# Altium schematic symbol library jlcpcb_2025_04_capacitors_extended_0805.schlib: 3281 symbols (part 7 of 18)
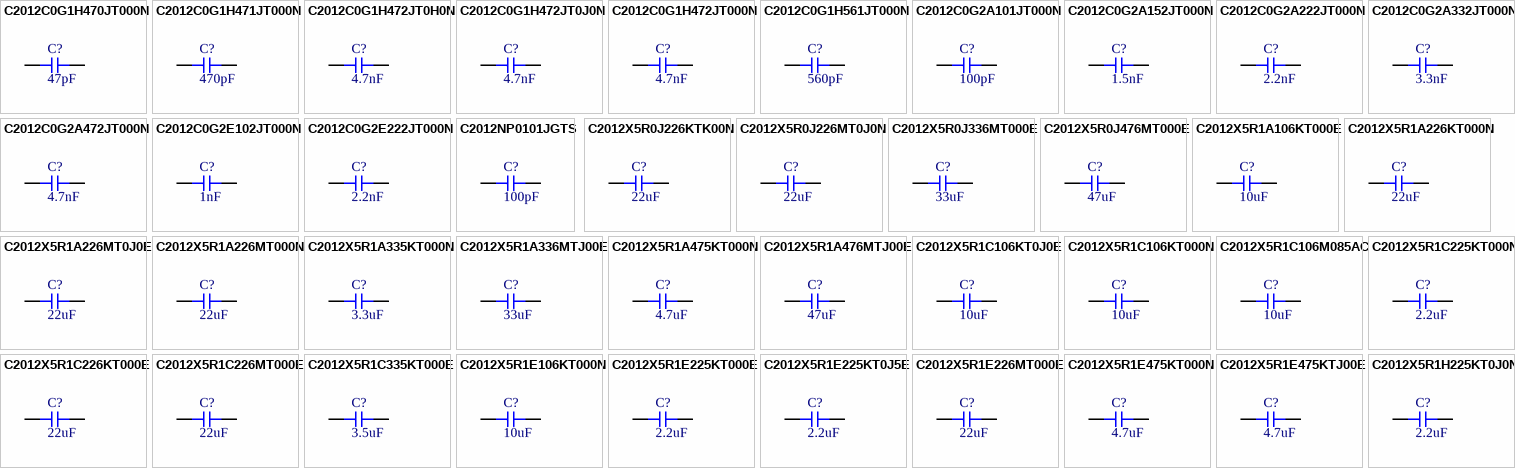
[diagram p88: symbols C2012C0G1H470JT000N to C2012X5R1H225KT0J0N]

## C2012C0G2E102JT000N
designator C?  Capacitance: 1nF  (hidden comment: *)
Capacitor, Ceramic (MLCC), 1nF, ±5%, 250V, C0G, ±5%, SMD 0805; Manufacturer: TDK; Manufacturer Part Number: C2012C0G2E102JT000N; Package Size: 0805; JLCPCB Basic Part: No; JLCPCB Part Number: C343010; Supplier 1: LCSC; Category: Capacitors - MLCC; Supplier Part Number 1: C343010; Tolerance: ±5%; Voltage Rating: 250V; Temperature Coefficient: C0G; RoHS: Yes; ComponentLink1Description: Datasheet; ComponentLink1URL: https://wmsc.lcsc.com/wmsc/upload/file/pdf/v2/lcsc/2304140030_TDK-C2012C0G2E102JT000N_C343010.pdf; ComponentLink2Description: JLCPCB Part URL; ComponentLink2URL: https://jlcpcb.com/partdetail/C343010; ComponentLink3Description: LCSC Part URL; ComponentLink3URL: https://lcsc.com/product-detail/Multilayer-Ceramic-Capacitors-MLCC---SMD-SMT_TDK-TDK-C2012C0G2E102JT000N_C343010.html
footprint CAP-0805 (0805 (2012M) Capacitor)
pins: 1, 2

## C2012C0G2E222JT000N
designator C?  Capacitance: 2.2nF  (hidden comment: *)
Capacitor, Ceramic (MLCC), 2.2nF, ±5%, 250V, C0G, ±5%, SMD 0805; Manufacturer: TDK; Manufacturer Part Number: C2012C0G2E222JT000N; Package Size: 0805; JLCPCB Basic Part: No; JLCPCB Part Number: C342971; Supplier 1: LCSC; Category: Capacitors - MLCC; Supplier Part Number 1: C342971; Tolerance: ±5%; Voltage Rating: 250V; Temperature Coefficient: C0G; RoHS: Yes; ComponentLink1Description: Datasheet; ComponentLink1URL: https://wmsc.lcsc.com/wmsc/upload/file/pdf/v2/lcsc/2304140030_TDK-C2012C0G2E222JT000N_C342971.pdf; ComponentLink2Description: JLCPCB Part URL; ComponentLink2URL: https://jlcpcb.com/partdetail/C342971; ComponentLink3Description: LCSC Part URL; ComponentLink3URL: https://lcsc.com/product-detail/Multilayer-Ceramic-Capacitors-MLCC---SMD-SMT_TDK-TDK-C2012C0G2E222JT000N_C342971.html
footprint CAP-0805 (0805 (2012M) Capacitor)
pins: 1, 2

## C2012NP0101JGTS
designator C?  Capacitance: 100pF  (hidden comment: *)
Capacitor, Ceramic (MLCC), 100pF, ±5%, 50V, NP0, ±5%, SMD 0805; Manufacturer: Darfon Elec; Manufacturer Part Number: C2012NP0101JGTS; Package Size: 0805; JLCPCB Basic Part: No; JLCPCB Part Number: C725576; Supplier 1: LCSC; Category: Capacitors - MLCC; Supplier Part Number 1: C725576; Tolerance: ±5%; Voltage Rating: 50V; Temperature Coefficient: NP0; RoHS: Yes; ComponentLink1Description: Datasheet; ComponentLink1URL: https://wmsc.lcsc.com/wmsc/upload/file/pdf/v2/lcsc/2304140030_Darfon-Elec-C2012NP0101JGTS_C725576.pdf; ComponentLink2Description: JLCPCB Part URL; ComponentLink2URL: https://jlcpcb.com/partdetail/C725576; ComponentLink3Description: LCSC Part URL; ComponentLink3URL: https://lcsc.com/product-detail/Multilayer-Ceramic-Capacitors-MLCC---SMD-SMT_Darfon-Elec-Darfon-Elec-C2012NP0101JGTS_C725576.html
footprint CAP-0805 (0805 (2012M) Capacitor)
pins: 1, 2

## C2012X5R0J226KTK00N
designator C?  Capacitance: 22uF  (hidden comment: *)
Capacitor, Ceramic (MLCC), 22uF, ±10%, 6.3V, X5R, ±10%, SMD 0805; Manufacturer: TDK; Manufacturer Part Number: C2012X5R0J226KTK00N; Package Size: 0805; JLCPCB Basic Part: No; JLCPCB Part Number: C342679; Supplier 1: LCSC; Category: Capacitors - MLCC; Supplier Part Number 1: C342679; Tolerance: ±10%; Voltage Rating: 6.3V; Temperature Coefficient: X5R; RoHS: Yes; ComponentLink1Description: Datasheet; ComponentLink1URL: https://wmsc.lcsc.com/wmsc/upload/file/pdf/v2/lcsc/2304140030_TDK-C2012X5R0J226KTK00N_C342679.pdf; ComponentLink2Description: JLCPCB Part URL; ComponentLink2URL: https://jlcpcb.com/partdetail/C342679; ComponentLink3Description: LCSC Part URL; ComponentLink3URL: https://lcsc.com/product-detail/Multilayer-Ceramic-Capacitors-MLCC---SMD-SMT_TDK-TDK-C2012X5R0J226KTK00N_C342679.html
footprint CAP-0805 (0805 (2012M) Capacitor)
pins: 1, 2

## C2012X5R0J226MT0J0N
designator C?  Capacitance: 22uF  (hidden comment: *)
Capacitor, Ceramic (MLCC), 22uF, ±20%, 6.3V, X5R, ±20%, SMD 0805; Manufacturer: TDK; Manufacturer Part Number: C2012X5R0J226MT0J0N; Package Size: 0805; JLCPCB Basic Part: No; JLCPCB Part Number: C695149; Supplier 1: LCSC; Category: Capacitors - MLCC; Supplier Part Number 1: C695149; Tolerance: ±20%; Voltage Rating: 6.3V; Temperature Coefficient: X5R; RoHS: Yes; ComponentLink1Description: Datasheet; ComponentLink1URL: https://wmsc.lcsc.com/wmsc/upload/file/pdf/v2/lcsc/2304140030_TDK-C2012X5R0J226MT0J0N_C695149.pdf; ComponentLink2Description: JLCPCB Part URL; ComponentLink2URL: https://jlcpcb.com/partdetail/C695149; ComponentLink3Description: LCSC Part URL; ComponentLink3URL: https://lcsc.com/product-detail/Multilayer-Ceramic-Capacitors-MLCC---SMD-SMT_TDK-TDK-C2012X5R0J226MT0J0N_C695149.html
footprint CAP-0805 (0805 (2012M) Capacitor)
pins: 1, 2

## C2012X5R0J336MT000E
designator C?  Capacitance: 33uF  (hidden comment: *)
Capacitor, Ceramic (MLCC), 33uF, ±20%, 6.3V, X5R, ±20%, SMD 0805; Manufacturer: TDK; Manufacturer Part Number: C2012X5R0J336MT000E; Package Size: 0805; JLCPCB Basic Part: No; JLCPCB Part Number: C432920; Supplier 1: LCSC; Category: Capacitors - MLCC; Supplier Part Number 1: C432920; Tolerance: ±20%; Voltage Rating: 6.3V; Temperature Coefficient: X5R; RoHS: Yes; ComponentLink1Description: Datasheet; ComponentLink1URL: https://wmsc.lcsc.com/wmsc/upload/file/pdf/v2/lcsc/2304140030_TDK-C2012X5R0J336MT000E_C432920.pdf; ComponentLink2Description: JLCPCB Part URL; ComponentLink2URL: https://jlcpcb.com/partdetail/C432920; ComponentLink3Description: LCSC Part URL; ComponentLink3URL: https://lcsc.com/product-detail/Multilayer-Ceramic-Capacitors-MLCC---SMD-SMT_TDK-TDK-C2012X5R0J336MT000E_C432920.html
footprint CAP-0805 (0805 (2012M) Capacitor)
pins: 1, 2

## C2012X5R0J476MT000E
designator C?  Capacitance: 47uF  (hidden comment: *)
Capacitor, Ceramic (MLCC), 47uF, ±20%, 6.3V, X5R, ±20%, SMD 0805; Manufacturer: TDK; Manufacturer Part Number: C2012X5R0J476MT000E; Package Size: 0805; JLCPCB Basic Part: No; JLCPCB Part Number: C342749; Supplier 1: LCSC; Category: Capacitors - MLCC; Supplier Part Number 1: C342749; Tolerance: ±20%; Voltage Rating: 6.3V; Temperature Coefficient: X5R; RoHS: Yes; ComponentLink1Description: Datasheet; ComponentLink1URL: https://wmsc.lcsc.com/wmsc/upload/file/pdf/v2/lcsc/2304140030_TDK-C2012X5R0J476MT000E_C342749.pdf; ComponentLink2Description: JLCPCB Part URL; ComponentLink2URL: https://jlcpcb.com/partdetail/C342749; ComponentLink3Description: LCSC Part URL; ComponentLink3URL: https://lcsc.com/product-detail/Multilayer-Ceramic-Capacitors-MLCC---SMD-SMT_TDK-TDK-C2012X5R0J476MT000E_C342749.html
footprint CAP-0805 (0805 (2012M) Capacitor)
pins: 1, 2

## C2012X5R1A106KT000E
designator C?  Capacitance: 10uF  (hidden comment: *)
Capacitor, Ceramic (MLCC), 10uF, ±10%, 10V, X5R, ±10%, SMD 0805; Manufacturer: TDK; Manufacturer Part Number: C2012X5R1A106KT000E; Package Size: 0805; JLCPCB Basic Part: No; JLCPCB Part Number: C329960; Supplier 1: LCSC; Category: Capacitors - MLCC; Supplier Part Number 1: C329960; Tolerance: ±10%; Voltage Rating: 10V; Temperature Coefficient: X5R; RoHS: Yes; ComponentLink1Description: Datasheet; ComponentLink1URL: https://wmsc.lcsc.com/wmsc/upload/file/pdf/v2/lcsc/2201242230_TDK-C2012X5R1A106KT000E_C329960.pdf; ComponentLink2Description: JLCPCB Part URL; ComponentLink2URL: https://jlcpcb.com/partdetail/C329960; ComponentLink3Description: LCSC Part URL; ComponentLink3URL: https://lcsc.com/product-detail/Multilayer-Ceramic-Capacitors-MLCC---SMD-SMT_TDK-TDK-C2012X5R1A106KT000E_C329960.html
footprint CAP-0805 (0805 (2012M) Capacitor)
pins: 1, 2

## C2012X5R1A226KT000N
designator C?  Capacitance: 22uF  (hidden comment: *)
Capacitor, Ceramic (MLCC), 22uF, ±10%, 10V, X5R, ±10%, SMD 0805; Manufacturer: TDK; Manufacturer Part Number: C2012X5R1A226KT000N; Package Size: 0805; JLCPCB Basic Part: No; JLCPCB Part Number: C76634; Supplier 1: LCSC; Category: Capacitors - MLCC; Supplier Part Number 1: C76634; Tolerance: ±10%; Voltage Rating: 10V; Temperature Coefficient: X5R; RoHS: Yes; ComponentLink1Description: Datasheet; ComponentLink1URL: https://wmsc.lcsc.com/wmsc/upload/file/pdf/v2/lcsc/2304140030_TDK-C2012X5R1A226KT000N_C76634.pdf; ComponentLink2Description: JLCPCB Part URL; ComponentLink2URL: https://jlcpcb.com/partdetail/C76634; ComponentLink3Description: LCSC Part URL; ComponentLink3URL: https://lcsc.com/product-detail/Multilayer-Ceramic-Capacitors-MLCC---SMD-SMT_TDK-TDK-C2012X5R1A226KT000N_C76634.html
footprint CAP-0805 (0805 (2012M) Capacitor)
pins: 1, 2

## C2012X5R1A226MT0J0E
designator C?  Capacitance: 22uF  (hidden comment: *)
Capacitor, Ceramic (MLCC), 22uF, ±20%, 10V, X5R, ±20%, SMD 0805; Manufacturer: TDK; Manufacturer Part Number: C2012X5R1A226MT0J0E; Package Size: 0805; JLCPCB Basic Part: No; JLCPCB Part Number: C361180; Supplier 1: LCSC; Category: Capacitors - MLCC; Supplier Part Number 1: C361180; Tolerance: ±20%; Voltage Rating: 10V; Temperature Coefficient: X5R; RoHS: Yes; ComponentLink1Description: Datasheet; ComponentLink1URL: https://wmsc.lcsc.com/wmsc/upload/file/pdf/v2/lcsc/1912111437_TDK-C2012X5R1A226MT0J0E_C361180.pdf; ComponentLink2Description: JLCPCB Part URL; ComponentLink2URL: https://jlcpcb.com/partdetail/C361180; ComponentLink3Description: LCSC Part URL; ComponentLink3URL: https://lcsc.com/product-detail/Multilayer-Ceramic-Capacitors-MLCC---SMD-SMT_TDK-TDK-C2012X5R1A226MT0J0E_C361180.html
footprint CAP-0805 (0805 (2012M) Capacitor)
pins: 1, 2

## C2012X5R1A226MT000N
designator C?  Capacitance: 22uF  (hidden comment: *)
Capacitor, Ceramic (MLCC), 22uF, ±20%, 10V, X5R, ±20%, SMD 0805; Manufacturer: TDK; Manufacturer Part Number: C2012X5R1A226MT000N; Package Size: 0805; JLCPCB Basic Part: No; JLCPCB Part Number: C342715; Supplier 1: LCSC; Category: Capacitors - MLCC; Supplier Part Number 1: C342715; Tolerance: ±20%; Voltage Rating: 10V; Temperature Coefficient: X5R; RoHS: Yes; ComponentLink1Description: Datasheet; ComponentLink1URL: https://wmsc.lcsc.com/wmsc/upload/file/pdf/v2/lcsc/2304140030_TDK-C2012X5R1A226MT000N_C342715.pdf; ComponentLink2Description: JLCPCB Part URL; ComponentLink2URL: https://jlcpcb.com/partdetail/C342715; ComponentLink3Description: LCSC Part URL; ComponentLink3URL: https://lcsc.com/product-detail/Multilayer-Ceramic-Capacitors-MLCC---SMD-SMT_TDK-TDK-C2012X5R1A226MT000N_C342715.html
footprint CAP-0805 (0805 (2012M) Capacitor)
pins: 1, 2

## C2012X5R1A335KT000N
designator C?  Capacitance: 3.3uF  (hidden comment: *)
Capacitor, Ceramic (MLCC), 3.3uF, ±10%, 10V, X5R, ±10%, SMD 0805; Manufacturer: TDK; Manufacturer Part Number: C2012X5R1A335KT000N; Package Size: 0805; JLCPCB Basic Part: No; JLCPCB Part Number: C76635; Supplier 1: LCSC; Category: Capacitors - MLCC; Supplier Part Number 1: C76635; Tolerance: ±10%; Voltage Rating: 10V; Temperature Coefficient: X5R; RoHS: Yes; ComponentLink1Description: Datasheet; ComponentLink1URL: https://wmsc.lcsc.com/wmsc/upload/file/pdf/v2/lcsc/2304140030_TDK-C2012X5R1A335KT000N_C76635.pdf; ComponentLink2Description: JLCPCB Part URL; ComponentLink2URL: https://jlcpcb.com/partdetail/C76635; ComponentLink3Description: LCSC Part URL; ComponentLink3URL: https://lcsc.com/product-detail/Multilayer-Ceramic-Capacitors-MLCC---SMD-SMT_TDK-TDK-C2012X5R1A335KT000N_C76635.html
footprint CAP-0805 (0805 (2012M) Capacitor)
pins: 1, 2

## C2012X5R1A336MTJ00E
designator C?  Capacitance: 33uF  (hidden comment: *)
Capacitor, Ceramic (MLCC), 33uF, ±20%, 10V, X5R, ±20%, SMD 0805; Manufacturer: TDK; Manufacturer Part Number: C2012X5R1A336MTJ00E; Package Size: 0805; JLCPCB Basic Part: No; JLCPCB Part Number: C342635; Supplier 1: LCSC; Category: Capacitors - MLCC; Supplier Part Number 1: C342635; Tolerance: ±20%; Voltage Rating: 10V; Temperature Coefficient: X5R; RoHS: Yes; ComponentLink1Description: Datasheet; ComponentLink1URL: https://wmsc.lcsc.com/wmsc/upload/file/pdf/v2/lcsc/2304140030_TDK-C2012X5R1A336MTJ00E_C342635.pdf; ComponentLink2Description: JLCPCB Part URL; ComponentLink2URL: https://jlcpcb.com/partdetail/C342635; ComponentLink3Description: LCSC Part URL; ComponentLink3URL: https://lcsc.com/product-detail/Multilayer-Ceramic-Capacitors-MLCC---SMD-SMT_TDK-TDK-C2012X5R1A336MTJ00E_C342635.html
footprint CAP-0805 (0805 (2012M) Capacitor)
pins: 1, 2

## C2012X5R1A475KT000N
designator C?  Capacitance: 4.7uF  (hidden comment: *)
Capacitor, Ceramic (MLCC), 4.7uF, ±10%, 10V, X5R, ±10%, SMD 0805; Manufacturer: TDK; Manufacturer Part Number: C2012X5R1A475KT000N; Package Size: 0805; JLCPCB Basic Part: No; JLCPCB Part Number: C338005; Supplier 1: LCSC; Category: Capacitors - MLCC; Supplier Part Number 1: C338005; Tolerance: ±10%; Voltage Rating: 10V; Temperature Coefficient: X5R; RoHS: Yes; ComponentLink1Description: Datasheet; ComponentLink1URL: https://wmsc.lcsc.com/wmsc/upload/file/pdf/v2/lcsc/2304140030_TDK-C2012X5R1A475KT000N_C338005.pdf; ComponentLink2Description: JLCPCB Part URL; ComponentLink2URL: https://jlcpcb.com/partdetail/C338005; ComponentLink3Description: LCSC Part URL; ComponentLink3URL: https://lcsc.com/product-detail/Multilayer-Ceramic-Capacitors-MLCC---SMD-SMT_TDK-TDK-C2012X5R1A475KT000N_C338005.html
footprint CAP-0805 (0805 (2012M) Capacitor)
pins: 1, 2

## C2012X5R1A476MTJ00E
designator C?  Capacitance: 47uF  (hidden comment: *)
Capacitor, Ceramic (MLCC), 47uF, ±20%, 10V, X5R, ±20%, SMD 0805; Manufacturer: TDK; Manufacturer Part Number: C2012X5R1A476MTJ00E; Package Size: 0805; JLCPCB Basic Part: No; JLCPCB Part Number: C76636; Supplier 1: LCSC; Category: Capacitors - MLCC; Supplier Part Number 1: C76636; Tolerance: ±20%; Voltage Rating: 10V; Temperature Coefficient: X5R; RoHS: Yes; ComponentLink1Description: Datasheet; ComponentLink1URL: https://wmsc.lcsc.com/wmsc/upload/file/pdf/v2/lcsc/2312061731_TDK-C2012X5R1A476MTJ00E_C76636.pdf; ComponentLink2Description: JLCPCB Part URL; ComponentLink2URL: https://jlcpcb.com/partdetail/C76636; ComponentLink3Description: LCSC Part URL; ComponentLink3URL: https://lcsc.com/product-detail/Multilayer-Ceramic-Capacitors-MLCC---SMD-SMT_TDK-TDK-C2012X5R1A476MTJ00E_C76636.html
footprint CAP-0805 (0805 (2012M) Capacitor)
pins: 1, 2

## C2012X5R1C106KT0J0E
designator C?  Capacitance: 10uF  (hidden comment: *)
Capacitor, Ceramic (MLCC), 10uF, ±10%, 16V, X5R, ±10%, SMD 0805; Manufacturer: TDK; Manufacturer Part Number: C2012X5R1C106KT0J0E; Package Size: 0805; JLCPCB Basic Part: No; JLCPCB Part Number: C342740; Supplier 1: LCSC; Category: Capacitors - MLCC; Supplier Part Number 1: C342740; Tolerance: ±10%; Voltage Rating: 16V; Temperature Coefficient: X5R; RoHS: Yes; ComponentLink1Description: Datasheet; ComponentLink1URL: https://wmsc.lcsc.com/wmsc/upload/file/pdf/v2/lcsc/2304140030_TDK-C2012X5R1C106KT0J0E_C342740.pdf; ComponentLink2Description: JLCPCB Part URL; ComponentLink2URL: https://jlcpcb.com/partdetail/C342740; ComponentLink3Description: LCSC Part URL; ComponentLink3URL: https://lcsc.com/product-detail/Multilayer-Ceramic-Capacitors-MLCC---SMD-SMT_TDK-TDK-C2012X5R1C106KT0J0E_C342740.html
footprint CAP-0805 (0805 (2012M) Capacitor)
pins: 1, 2

## C2012X5R1C106KT000N
designator C?  Capacitance: 10uF  (hidden comment: *)
Capacitor, Ceramic (MLCC), 10uF, ±10%, 16V, X5R, ±10%, SMD 0805; Manufacturer: TDK; Manufacturer Part Number: C2012X5R1C106KT000N; Package Size: 0805; JLCPCB Basic Part: No; JLCPCB Part Number: C338041; Supplier 1: LCSC; Category: Capacitors - MLCC; Supplier Part Number 1: C338041; Tolerance: ±10%; Voltage Rating: 16V; Temperature Coefficient: X5R; RoHS: Yes; ComponentLink1Description: Datasheet; ComponentLink1URL: https://wmsc.lcsc.com/wmsc/upload/file/pdf/v2/lcsc/2304140030_TDK-C2012X5R1C106KT000N_C338041.pdf; ComponentLink2Description: JLCPCB Part URL; ComponentLink2URL: https://jlcpcb.com/partdetail/C338041; ComponentLink3Description: LCSC Part URL; ComponentLink3URL: https://lcsc.com/product-detail/Multilayer-Ceramic-Capacitors-MLCC---SMD-SMT_TDK-TDK-C2012X5R1C106KT000N_C338041.html
footprint CAP-0805 (0805 (2012M) Capacitor)
pins: 1, 2

## C2012X5R1C106M085AC
designator C?  Capacitance: 10uF  (hidden comment: *)
Capacitor, Ceramic (MLCC), 10uF, ±20%, 16V, X5R, ±20%, SMD 0805; Manufacturer: TDK; Manufacturer Part Number: C2012X5R1C106M085AC; Package Size: 0805; JLCPCB Basic Part: No; JLCPCB Part Number: C171747; Supplier 1: LCSC; Category: Capacitors - MLCC; Supplier Part Number 1: C171747; Tolerance: ±20%; Voltage Rating: 16V; Temperature Coefficient: X5R; RoHS: Yes; ComponentLink1Description: Datasheet; ComponentLink1URL: https://wmsc.lcsc.com/wmsc/upload/file/pdf/v2/lcsc/2304140030_TDK-C2012X5R1C106M085AC_C171747.pdf; ComponentLink2Description: JLCPCB Part URL; ComponentLink2URL: https://jlcpcb.com/partdetail/C171747; ComponentLink3Description: LCSC Part URL; ComponentLink3URL: https://lcsc.com/product-detail/Multilayer-Ceramic-Capacitors-MLCC---SMD-SMT_TDK-TDK-C2012X5R1C106M085AC_C171747.html
footprint CAP-0805 (0805 (2012M) Capacitor)
pins: 1, 2

## C2012X5R1C225KT000N
designator C?  Capacitance: 2.2uF  (hidden comment: *)
Capacitor, Ceramic (MLCC), 2.2uF, ±10%, 16V, X5R, ±10%, SMD 0805; Manufacturer: TDK; Manufacturer Part Number: C2012X5R1C225KT000N; Package Size: 0805; JLCPCB Basic Part: No; JLCPCB Part Number: C338006; Supplier 1: LCSC; Category: Capacitors - MLCC; Supplier Part Number 1: C338006; Tolerance: ±10%; Voltage Rating: 16V; Temperature Coefficient: X5R; RoHS: Yes; ComponentLink1Description: Datasheet; ComponentLink1URL: https://wmsc.lcsc.com/wmsc/upload/file/pdf/v2/lcsc/2304140030_TDK-C2012X5R1C225KT000N_C338006.pdf; ComponentLink2Description: JLCPCB Part URL; ComponentLink2URL: https://jlcpcb.com/partdetail/C338006; ComponentLink3Description: LCSC Part URL; ComponentLink3URL: https://lcsc.com/product-detail/Multilayer-Ceramic-Capacitors-MLCC---SMD-SMT_TDK-TDK-C2012X5R1C225KT000N_C338006.html
footprint CAP-0805 (0805 (2012M) Capacitor)
pins: 1, 2

## C2012X5R1C226KT000E
designator C?  Capacitance: 22uF  (hidden comment: *)
Capacitor, Ceramic (MLCC), 22uF, ±10%, 16V, X5R, ±10%, SMD 0805; Manufacturer: TDK; Manufacturer Part Number: C2012X5R1C226KT000E; Package Size: 0805; JLCPCB Basic Part: No; JLCPCB Part Number: C76637; Supplier 1: LCSC; Category: Capacitors - MLCC; Supplier Part Number 1: C76637; Tolerance: ±10%; Voltage Rating: 16V; Temperature Coefficient: X5R; RoHS: Yes; ComponentLink1Description: Datasheet; ComponentLink1URL: https://wmsc.lcsc.com/wmsc/upload/file/pdf/v2/lcsc/2304140030_TDK-C2012X5R1C226KT000E_C76637.pdf; ComponentLink2Description: JLCPCB Part URL; ComponentLink2URL: https://jlcpcb.com/partdetail/C76637; ComponentLink3Description: LCSC Part URL; ComponentLink3URL: https://lcsc.com/product-detail/Multilayer-Ceramic-Capacitors-MLCC---SMD-SMT_TDK-TDK-C2012X5R1C226KT000E_C76637.html
footprint CAP-0805 (0805 (2012M) Capacitor)
pins: 1, 2

## C2012X5R1C226MT000E
designator C?  Capacitance: 22uF  (hidden comment: *)
Capacitor, Ceramic (MLCC), 22uF, ±20%, 16V, X5R, ±20%, SMD 0805; Manufacturer: TDK; Manufacturer Part Number: C2012X5R1C226MT000E; Package Size: 0805; JLCPCB Basic Part: No; JLCPCB Part Number: C329947; Supplier 1: LCSC; Category: Capacitors - MLCC; Supplier Part Number 1: C329947; Tolerance: ±20%; Voltage Rating: 16V; Temperature Coefficient: X5R; RoHS: Yes; ComponentLink1Description: Datasheet; ComponentLink1URL: https://wmsc.lcsc.com/wmsc/upload/file/pdf/v2/lcsc/2304140030_TDK-C2012X5R1C226MT000E_C329947.pdf; ComponentLink2Description: JLCPCB Part URL; ComponentLink2URL: https://jlcpcb.com/partdetail/C329947; ComponentLink3Description: LCSC Part URL; ComponentLink3URL: https://lcsc.com/product-detail/Multilayer-Ceramic-Capacitors-MLCC---SMD-SMT_TDK-TDK-C2012X5R1C226MT000E_C329947.html
footprint CAP-0805 (0805 (2012M) Capacitor)
pins: 1, 2

## C2012X5R1C335KT000E
designator C?  Capacitance: 3.5uF  (hidden comment: *)
Capacitor, Ceramic (MLCC), 3.5uF, ±10%, 16V, X5R, ±10%, SMD 0805; Manufacturer: TDK; Manufacturer Part Number: C2012X5R1C335KT000E; Package Size: 0805; JLCPCB Basic Part: No; JLCPCB Part Number: C2939042; Supplier 1: LCSC; Category: Capacitors - MLCC; Supplier Part Number 1: C2939042; Tolerance: ±10%; Voltage Rating: 16V; Temperature Coefficient: X5R; RoHS: Yes; ComponentLink1Description: Datasheet; ComponentLink1URL: https://wmsc.lcsc.com/wmsc/upload/file/pdf/v2/lcsc/2201121830_TDK-C2012X5R1C335KT000E_C2939042.pdf; ComponentLink2Description: JLCPCB Part URL; ComponentLink2URL: https://jlcpcb.com/partdetail/C2939042; ComponentLink3Description: LCSC Part URL; ComponentLink3URL: https://lcsc.com/product-detail/Multilayer-Ceramic-Capacitors-MLCC---SMD-SMT_TDK-TDK-C2012X5R1C335KT000E_C2939042.html
footprint CAP-0805 (0805 (2012M) Capacitor)
pins: 1, 2

## C2012X5R1E106KT000N
designator C?  Capacitance: 10uF  (hidden comment: *)
Capacitor, Ceramic (MLCC), 10uF, ±10%, 25V, X5R, ±10%, SMD 0805; Manufacturer: TDK; Manufacturer Part Number: C2012X5R1E106KT000N; Package Size: 0805; JLCPCB Basic Part: No; JLCPCB Part Number: C329933; Supplier 1: LCSC; Category: Capacitors - MLCC; Supplier Part Number 1: C329933; Tolerance: ±10%; Voltage Rating: 25V; Temperature Coefficient: X5R; RoHS: Yes; ComponentLink1Description: Datasheet; ComponentLink1URL: https://wmsc.lcsc.com/wmsc/upload/file/pdf/v2/lcsc/2304140030_TDK-C2012X5R1E106KT000N_C329933.pdf; ComponentLink2Description: JLCPCB Part URL; ComponentLink2URL: https://jlcpcb.com/partdetail/C329933; ComponentLink3Description: LCSC Part URL; ComponentLink3URL: https://lcsc.com/product-detail/Multilayer-Ceramic-Capacitors-MLCC---SMD-SMT_TDK-TDK-C2012X5R1E106KT000N_C329933.html
footprint CAP-0805 (0805 (2012M) Capacitor)
pins: 1, 2

## C2012X5R1E225KT000E
designator C?  Capacitance: 2.2uF  (hidden comment: *)
Capacitor, Ceramic (MLCC), 2.2uF, ±10%, 25V, X5R, ±10%, SMD 0805; Manufacturer: TDK; Manufacturer Part Number: C2012X5R1E225KT000E; Package Size: 0805; JLCPCB Basic Part: No; JLCPCB Part Number: C342586; Supplier 1: LCSC; Category: Capacitors - MLCC; Supplier Part Number 1: C342586; Tolerance: ±10%; Voltage Rating: 25V; Temperature Coefficient: X5R; RoHS: Yes; ComponentLink1Description: Datasheet; ComponentLink1URL: https://wmsc.lcsc.com/wmsc/upload/file/pdf/v2/lcsc/2304140030_TDK-C2012X5R1E225KT000E_C342586.pdf; ComponentLink2Description: JLCPCB Part URL; ComponentLink2URL: https://jlcpcb.com/partdetail/C342586; ComponentLink3Description: LCSC Part URL; ComponentLink3URL: https://lcsc.com/product-detail/Multilayer-Ceramic-Capacitors-MLCC---SMD-SMT_TDK-TDK-C2012X5R1E225KT000E_C342586.html
footprint CAP-0805 (0805 (2012M) Capacitor)
pins: 1, 2

## C2012X5R1E225KT0J5E
designator C?  Capacitance: 2.2uF  (hidden comment: *)
Capacitor, Ceramic (MLCC), 2.2uF, ±10%, 25V, X5R, ±10%, SMD 0805; Manufacturer: TDK; Manufacturer Part Number: C2012X5R1E225KT0J5E; Package Size: 0805; JLCPCB Basic Part: No; JLCPCB Part Number: C76638; Supplier 1: LCSC; Category: Capacitors - MLCC; Supplier Part Number 1: C76638; Tolerance: ±10%; Voltage Rating: 25V; Temperature Coefficient: X5R; RoHS: Yes; ComponentLink1Description: Datasheet; ComponentLink1URL: https://wmsc.lcsc.com/wmsc/upload/file/pdf/v2/lcsc/2304140030_TDK-C2012X5R1E225KT0J5E_C76638.pdf; ComponentLink2Description: JLCPCB Part URL; ComponentLink2URL: https://jlcpcb.com/partdetail/C76638; ComponentLink3Description: LCSC Part URL; ComponentLink3URL: https://lcsc.com/product-detail/Multilayer-Ceramic-Capacitors-MLCC---SMD-SMT_TDK-TDK-C2012X5R1E225KT0J5E_C76638.html
footprint CAP-0805 (0805 (2012M) Capacitor)
pins: 1, 2

## C2012X5R1E226MT000E
designator C?  Capacitance: 22uF  (hidden comment: *)
Capacitor, Ceramic (MLCC), 22uF, ±20%, 25V, X5R, ±20%, SMD 0805; Manufacturer: TDK; Manufacturer Part Number: C2012X5R1E226MT000E; Package Size: 0805; JLCPCB Basic Part: No; JLCPCB Part Number: C338078; Supplier 1: LCSC; Category: Capacitors - MLCC; Supplier Part Number 1: C338078; Tolerance: ±20%; Voltage Rating: 25V; Temperature Coefficient: X5R; RoHS: Yes; ComponentLink1Description: Datasheet; ComponentLink1URL: https://wmsc.lcsc.com/wmsc/upload/file/pdf/v2/lcsc/2304140030_TDK-C2012X5R1E226MT000E_C338078.pdf; ComponentLink2Description: JLCPCB Part URL; ComponentLink2URL: https://jlcpcb.com/partdetail/C338078; ComponentLink3Description: LCSC Part URL; ComponentLink3URL: https://lcsc.com/product-detail/Multilayer-Ceramic-Capacitors-MLCC---SMD-SMT_TDK-TDK-C2012X5R1E226MT000E_C338078.html
footprint CAP-0805 (0805 (2012M) Capacitor)
pins: 1, 2

## C2012X5R1E475KT000N
designator C?  Capacitance: 4.7uF  (hidden comment: *)
Capacitor, Ceramic (MLCC), 4.7uF, ±10%, 25V, X5R, ±10%, SMD 0805; Manufacturer: TDK; Manufacturer Part Number: C2012X5R1E475KT000N; Package Size: 0805; JLCPCB Basic Part: No; JLCPCB Part Number: C445714; Supplier 1: LCSC; Category: Capacitors - MLCC; Supplier Part Number 1: C445714; Tolerance: ±10%; Voltage Rating: 25V; Temperature Coefficient: X5R; RoHS: Yes; ComponentLink1Description: Datasheet; ComponentLink1URL: https://wmsc.lcsc.com/wmsc/upload/file/pdf/v2/lcsc/2304140030_TDK-C2012X5R1E475KT000N_C445714.pdf; ComponentLink2Description: JLCPCB Part URL; ComponentLink2URL: https://jlcpcb.com/partdetail/C445714; ComponentLink3Description: LCSC Part URL; ComponentLink3URL: https://lcsc.com/product-detail/Multilayer-Ceramic-Capacitors-MLCC---SMD-SMT_TDK-TDK-C2012X5R1E475KT000N_C445714.html
footprint CAP-0805 (0805 (2012M) Capacitor)
pins: 1, 2

## C2012X5R1E475KTJ00E
designator C?  Capacitance: 4.7uF  (hidden comment: *)
Capacitor, Ceramic (MLCC), 4.7uF, ±10%, 25V, X5R, ±10%, SMD 0805; Manufacturer: TDK; Manufacturer Part Number: C2012X5R1E475KTJ00E; Package Size: 0805; JLCPCB Basic Part: No; JLCPCB Part Number: C435253; Supplier 1: LCSC; Category: Capacitors - MLCC; Supplier Part Number 1: C435253; Tolerance: ±10%; Voltage Rating: 25V; Temperature Coefficient: X5R; RoHS: Yes; ComponentLink1Description: Datasheet; ComponentLink1URL: https://wmsc.lcsc.com/wmsc/upload/file/pdf/v2/lcsc/2304140030_TDK-C2012X5R1E475KTJ00E_C435253.pdf; ComponentLink2Description: JLCPCB Part URL; ComponentLink2URL: https://jlcpcb.com/partdetail/C435253; ComponentLink3Description: LCSC Part URL; ComponentLink3URL: https://lcsc.com/product-detail/Multilayer-Ceramic-Capacitors-MLCC---SMD-SMT_TDK-TDK-C2012X5R1E475KTJ00E_C435253.html
footprint CAP-0805 (0805 (2012M) Capacitor)
pins: 1, 2

## C2012X5R1H225KT0J0N
designator C?  Capacitance: 2.2uF  (hidden comment: *)
Capacitor, Ceramic (MLCC), 2.2uF, ±10%, 50V, X5R, ±10%, SMD 0805; Manufacturer: TDK; Manufacturer Part Number: C2012X5R1H225KT0J0N; Package Size: 0805; JLCPCB Basic Part: No; JLCPCB Part Number: C880703; Supplier 1: LCSC; Category: Capacitors - MLCC; Supplier Part Number 1: C880703; Tolerance: ±10%; Voltage Rating: 50V; Temperature Coefficient: X5R; RoHS: Yes; ComponentLink1Description: Datasheet; ComponentLink1URL: https://wmsc.lcsc.com/wmsc/upload/file/pdf/v2/lcsc/2010170835_TDK-C2012X5R1H225KT0J0N_C880703.pdf; ComponentLink2Description: JLCPCB Part URL; ComponentLink2URL: https://jlcpcb.com/partdetail/C880703; ComponentLink3Description: LCSC Part URL; ComponentLink3URL: https://lcsc.com/product-detail/Multilayer-Ceramic-Capacitors-MLCC---SMD-SMT_TDK-TDK-C2012X5R1H225KT0J0N_C880703.html
footprint CAP-0805 (0805 (2012M) Capacitor)
pins: 1, 2

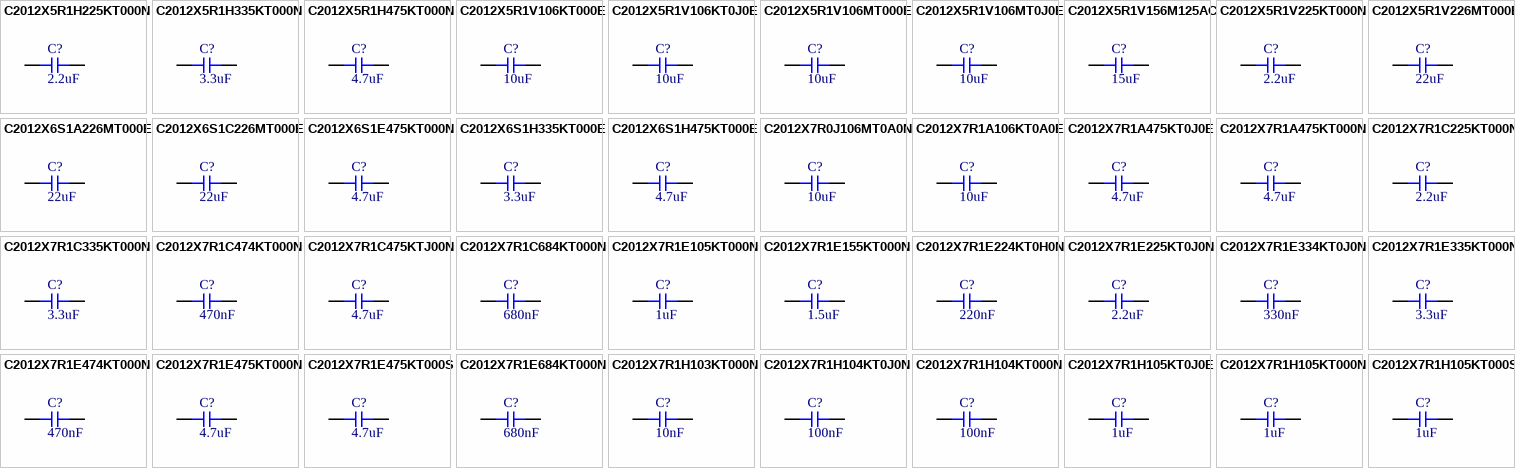
[diagram p28: symbols C2012X5R1H225KT000N to C2012X7R1H105KT000S]

## C2012X5R1H225KT000N
designator C?  Capacitance: 2.2uF  (hidden comment: *)
Capacitor, Ceramic (MLCC), 2.2uF, ±10%, 50V, X5R, ±10%, SMD 0805; Manufacturer: TDK; Manufacturer Part Number: C2012X5R1H225KT000N; Package Size: 0805; JLCPCB Basic Part: No; JLCPCB Part Number: C342802; Supplier 1: LCSC; Category: Capacitors - MLCC; Supplier Part Number 1: C342802; Tolerance: ±10%; Voltage Rating: 50V; Temperature Coefficient: X5R; RoHS: Yes; ComponentLink1Description: Datasheet; ComponentLink1URL: https://wmsc.lcsc.com/wmsc/upload/file/pdf/v2/lcsc/2304140030_TDK-C2012X5R1H225KT000N_C342802.pdf; ComponentLink2Description: JLCPCB Part URL; ComponentLink2URL: https://jlcpcb.com/partdetail/C342802; ComponentLink3Description: LCSC Part URL; ComponentLink3URL: https://lcsc.com/product-detail/Multilayer-Ceramic-Capacitors-MLCC---SMD-SMT_TDK-TDK-C2012X5R1H225KT000N_C342802.html
footprint CAP-0805 (0805 (2012M) Capacitor)
pins: 1, 2

## C2012X5R1H335KT000N
designator C?  Capacitance: 3.3uF  (hidden comment: *)
Capacitor, Ceramic (MLCC), 3.3uF, ±10%, 50V, X5R, ±10%, SMD 0805; Manufacturer: TDK; Manufacturer Part Number: C2012X5R1H335KT000N; Package Size: 0805; JLCPCB Basic Part: No; JLCPCB Part Number: C342775; Supplier 1: LCSC; Category: Capacitors - MLCC; Supplier Part Number 1: C342775; Tolerance: ±10%; Voltage Rating: 50V; Temperature Coefficient: X5R; RoHS: Yes; ComponentLink1Description: Datasheet; ComponentLink1URL: https://wmsc.lcsc.com/wmsc/upload/file/pdf/v2/lcsc/1912111437_TDK-C2012X5R1H335KT000N_C342775.pdf; ComponentLink2Description: JLCPCB Part URL; ComponentLink2URL: https://jlcpcb.com/partdetail/C342775; ComponentLink3Description: LCSC Part URL; ComponentLink3URL: https://lcsc.com/product-detail/Multilayer-Ceramic-Capacitors-MLCC---SMD-SMT_TDK-TDK-C2012X5R1H335KT000N_C342775.html
footprint CAP-0805 (0805 (2012M) Capacitor)
pins: 1, 2

## C2012X5R1H475KT000N
designator C?  Capacitance: 4.7uF  (hidden comment: *)
Capacitor, Ceramic (MLCC), 4.7uF, ±10%, 50V, X5R, ±10%, SMD 0805; Manufacturer: TDK; Manufacturer Part Number: C2012X5R1H475KT000N; Package Size: 0805; JLCPCB Basic Part: No; JLCPCB Part Number: C319187; Supplier 1: LCSC; Category: Capacitors - MLCC; Supplier Part Number 1: C319187; Tolerance: ±10%; Voltage Rating: 50V; Temperature Coefficient: X5R; RoHS: Yes; ComponentLink1Description: Datasheet; ComponentLink1URL: https://wmsc.lcsc.com/wmsc/upload/file/pdf/v2/lcsc/2304140030_TDK-C2012X5R1H475KT000N_C319187.pdf; ComponentLink2Description: JLCPCB Part URL; ComponentLink2URL: https://jlcpcb.com/partdetail/C319187; ComponentLink3Description: LCSC Part URL; ComponentLink3URL: https://lcsc.com/product-detail/Multilayer-Ceramic-Capacitors-MLCC---SMD-SMT_TDK-TDK-C2012X5R1H475KT000N_C319187.html
footprint CAP-0805 (0805 (2012M) Capacitor)
pins: 1, 2

## C2012X5R1V106KT000E
designator C?  Capacitance: 10uF  (hidden comment: *)
Capacitor, Ceramic (MLCC), 10uF, ±10%, 35V, X5R, ±10%, SMD 0805; Manufacturer: TDK; Manufacturer Part Number: C2012X5R1V106KT000E; Package Size: 0805; JLCPCB Basic Part: No; JLCPCB Part Number: C342722; Supplier 1: LCSC; Category: Capacitors - MLCC; Supplier Part Number 1: C342722; Tolerance: ±10%; Voltage Rating: 35V; Temperature Coefficient: X5R; RoHS: Yes; ComponentLink1Description: Datasheet; ComponentLink1URL: https://wmsc.lcsc.com/wmsc/upload/file/pdf/v2/lcsc/2304140030_TDK-C2012X5R1V106KT000E_C342722.pdf; ComponentLink2Description: JLCPCB Part URL; ComponentLink2URL: https://jlcpcb.com/partdetail/C342722; ComponentLink3Description: LCSC Part URL; ComponentLink3URL: https://lcsc.com/product-detail/Multilayer-Ceramic-Capacitors-MLCC---SMD-SMT_TDK-TDK-C2012X5R1V106KT000E_C342722.html
footprint CAP-0805 (0805 (2012M) Capacitor)
pins: 1, 2

## C2012X5R1V106KT0J0E
designator C?  Capacitance: 10uF  (hidden comment: *)
Capacitor, Ceramic (MLCC), 10uF, ±10%, 35V, X5R, ±10%, SMD 0805; Manufacturer: TDK; Manufacturer Part Number: C2012X5R1V106KT0J0E; Package Size: 0805; JLCPCB Basic Part: No; JLCPCB Part Number: C342724; Supplier 1: LCSC; Category: Capacitors - MLCC; Supplier Part Number 1: C342724; Tolerance: ±10%; Voltage Rating: 35V; Temperature Coefficient: X5R; RoHS: Yes; ComponentLink1Description: Datasheet; ComponentLink1URL: https://wmsc.lcsc.com/wmsc/upload/file/pdf/v2/lcsc/2304140030_TDK-C2012X5R1V106KT0J0E_C342724.pdf; ComponentLink2Description: JLCPCB Part URL; ComponentLink2URL: https://jlcpcb.com/partdetail/C342724; ComponentLink3Description: LCSC Part URL; ComponentLink3URL: https://lcsc.com/product-detail/Multilayer-Ceramic-Capacitors-MLCC---SMD-SMT_TDK-TDK-C2012X5R1V106KT0J0E_C342724.html
footprint CAP-0805 (0805 (2012M) Capacitor)
pins: 1, 2

## C2012X5R1V106MT000E
designator C?  Capacitance: 10uF  (hidden comment: *)
Capacitor, Ceramic (MLCC), 10uF, ±20%, 35V, X5R, ±20%, SMD 0805; Manufacturer: TDK; Manufacturer Part Number: C2012X5R1V106MT000E; Package Size: 0805; JLCPCB Basic Part: No; JLCPCB Part Number: C415295; Supplier 1: LCSC; Category: Capacitors - MLCC; Supplier Part Number 1: C415295; Tolerance: ±20%; Voltage Rating: 35V; Temperature Coefficient: X5R; RoHS: Yes; ComponentLink1Description: Datasheet; ComponentLink1URL: https://wmsc.lcsc.com/wmsc/upload/file/pdf/v2/lcsc/2304140030_TDK-C2012X5R1V106MT000E_C415295.pdf; ComponentLink2Description: JLCPCB Part URL; ComponentLink2URL: https://jlcpcb.com/partdetail/C415295; ComponentLink3Description: LCSC Part URL; ComponentLink3URL: https://lcsc.com/product-detail/Multilayer-Ceramic-Capacitors-MLCC---SMD-SMT_TDK-TDK-C2012X5R1V106MT000E_C415295.html
footprint CAP-0805 (0805 (2012M) Capacitor)
pins: 1, 2

## C2012X5R1V106MT0J0E
designator C?  Capacitance: 10uF  (hidden comment: *)
Capacitor, Ceramic (MLCC), 10uF, ±20%, 35V, X5R, ±20%, SMD 0805; Manufacturer: TDK; Manufacturer Part Number: C2012X5R1V106MT0J0E; Package Size: 0805; JLCPCB Basic Part: No; JLCPCB Part Number: C342723; Supplier 1: LCSC; Category: Capacitors - MLCC; Supplier Part Number 1: C342723; Tolerance: ±20%; Voltage Rating: 35V; Temperature Coefficient: X5R; RoHS: Yes; ComponentLink1Description: Datasheet; ComponentLink1URL: https://wmsc.lcsc.com/wmsc/upload/file/pdf/v2/lcsc/2304140030_TDK-C2012X5R1V106MT0J0E_C342723.pdf; ComponentLink2Description: JLCPCB Part URL; ComponentLink2URL: https://jlcpcb.com/partdetail/C342723; ComponentLink3Description: LCSC Part URL; ComponentLink3URL: https://lcsc.com/product-detail/Multilayer-Ceramic-Capacitors-MLCC---SMD-SMT_TDK-TDK-C2012X5R1V106MT0J0E_C342723.html
footprint CAP-0805 (0805 (2012M) Capacitor)
pins: 1, 2

## C2012X5R1V156M125AC
designator C?  Capacitance: 15uF  (hidden comment: *)
Capacitor, Ceramic (MLCC), 15uF, ±20%, 35V, X5R, ±20%, SMD 0805; Manufacturer: TDK; Manufacturer Part Number: C2012X5R1V156M125AC; Package Size: 0805; JLCPCB Basic Part: No; JLCPCB Part Number: C2168216; Supplier 1: LCSC; Category: Capacitors - MLCC; Supplier Part Number 1: C2168216; Tolerance: ±20%; Voltage Rating: 35V; Temperature Coefficient: X5R; RoHS: Yes; ComponentLink1Description: Datasheet; ComponentLink1URL: https://wmsc.lcsc.com/wmsc/upload/file/pdf/v2/lcsc/2304140030_TDK-C2012X5R1V156M125AC_C2168216.pdf; ComponentLink2Description: JLCPCB Part URL; ComponentLink2URL: https://jlcpcb.com/partdetail/C2168216; ComponentLink3Description: LCSC Part URL; ComponentLink3URL: https://lcsc.com/product-detail/Multilayer-Ceramic-Capacitors-MLCC---SMD-SMT_TDK-TDK-C2012X5R1V156M125AC_C2168216.html
footprint CAP-0805 (0805 (2012M) Capacitor)
pins: 1, 2

## C2012X5R1V225KT000N
designator C?  Capacitance: 2.2uF  (hidden comment: *)
Capacitor, Ceramic (MLCC), 2.2uF, ±10%, 35V, X5R, ±10%, SMD 0805; Manufacturer: TDK; Manufacturer Part Number: C2012X5R1V225KT000N; Package Size: 0805; JLCPCB Basic Part: No; JLCPCB Part Number: C342807; Supplier 1: LCSC; Category: Capacitors - MLCC; Supplier Part Number 1: C342807; Tolerance: ±10%; Voltage Rating: 35V; Temperature Coefficient: X5R; RoHS: Yes; ComponentLink1Description: Datasheet; ComponentLink1URL: https://wmsc.lcsc.com/wmsc/upload/file/pdf/v2/lcsc/2304140030_TDK-C2012X5R1V225KT000N_C342807.pdf; ComponentLink2Description: JLCPCB Part URL; ComponentLink2URL: https://jlcpcb.com/partdetail/C342807; ComponentLink3Description: LCSC Part URL; ComponentLink3URL: https://lcsc.com/product-detail/Multilayer-Ceramic-Capacitors-MLCC---SMD-SMT_TDK-TDK-C2012X5R1V225KT000N_C342807.html
footprint CAP-0805 (0805 (2012M) Capacitor)
pins: 1, 2

## C2012X5R1V226MT000E
designator C?  Capacitance: 22uF  (hidden comment: *)
Capacitor, Ceramic (MLCC), 22uF, ±20%, 35V, X5R, ±20%, SMD 0805; Manufacturer: TDK; Manufacturer Part Number: C2012X5R1V226MT000E; Package Size: 0805; JLCPCB Basic Part: No; JLCPCB Part Number: C338080; Supplier 1: LCSC; Category: Capacitors - MLCC; Supplier Part Number 1: C338080; Tolerance: ±20%; Voltage Rating: 35V; Temperature Coefficient: X5R; RoHS: Yes; ComponentLink1Description: Datasheet; ComponentLink1URL: https://wmsc.lcsc.com/wmsc/upload/file/pdf/v2/lcsc/2304140030_TDK-C2012X5R1V226MT000E_C338080.pdf; ComponentLink2Description: JLCPCB Part URL; ComponentLink2URL: https://jlcpcb.com/partdetail/C338080; ComponentLink3Description: LCSC Part URL; ComponentLink3URL: https://lcsc.com/product-detail/Multilayer-Ceramic-Capacitors-MLCC---SMD-SMT_TDK-TDK-C2012X5R1V226MT000E_C338080.html
footprint CAP-0805 (0805 (2012M) Capacitor)
pins: 1, 2

## C2012X6S1A226MT000E
designator C?  Capacitance: 22uF  (hidden comment: *)
Capacitor, Ceramic (MLCC), 22uF, ±20%, 10V, X6S, ±20%, SMD 0805; Manufacturer: TDK; Manufacturer Part Number: C2012X6S1A226MT000E; Package Size: 0805; JLCPCB Basic Part: No; JLCPCB Part Number: C342716; Supplier 1: LCSC; Category: Capacitors - MLCC; Supplier Part Number 1: C342716; Tolerance: ±20%; Voltage Rating: 10V; Temperature Coefficient: X6S; RoHS: Yes; ComponentLink1Description: Datasheet; ComponentLink1URL: https://wmsc.lcsc.com/wmsc/upload/file/pdf/v2/lcsc/2304140030_TDK-C2012X6S1A226MT000E_C342716.pdf; ComponentLink2Description: JLCPCB Part URL; ComponentLink2URL: https://jlcpcb.com/partdetail/C342716; ComponentLink3Description: LCSC Part URL; ComponentLink3URL: https://lcsc.com/product-detail/Multilayer-Ceramic-Capacitors-MLCC---SMD-SMT_TDK-TDK-C2012X6S1A226MT000E_C342716.html
footprint CAP-0805 (0805 (2012M) Capacitor)
pins: 1, 2

## C2012X6S1C226MT000E
designator C?  Capacitance: 22uF  (hidden comment: *)
Capacitor, Ceramic (MLCC), 22uF, ±20%, 16V, X6S, ±20%, SMD 0805; Manufacturer: TDK; Manufacturer Part Number: C2012X6S1C226MT000E; Package Size: 0805; JLCPCB Basic Part: No; JLCPCB Part Number: C415296; Supplier 1: LCSC; Category: Capacitors - MLCC; Supplier Part Number 1: C415296; Tolerance: ±20%; Voltage Rating: 16V; Temperature Coefficient: X6S; RoHS: Yes; ComponentLink1Description: Datasheet; ComponentLink1URL: https://wmsc.lcsc.com/wmsc/upload/file/pdf/v2/lcsc/2304140030_TDK-C2012X6S1C226MT000E_C415296.pdf; ComponentLink2Description: JLCPCB Part URL; ComponentLink2URL: https://jlcpcb.com/partdetail/C415296; ComponentLink3Description: LCSC Part URL; ComponentLink3URL: https://lcsc.com/product-detail/Multilayer-Ceramic-Capacitors-MLCC---SMD-SMT_TDK-TDK-C2012X6S1C226MT000E_C415296.html
footprint CAP-0805 (0805 (2012M) Capacitor)
pins: 1, 2

## C2012X6S1E475KT000N
designator C?  Capacitance: 4.7uF  (hidden comment: *)
Capacitor, Ceramic (MLCC), 4.7uF, ±10%, 25V, X6S, ±10%, SMD 0805; Manufacturer: TDK; Manufacturer Part Number: C2012X6S1E475KT000N; Package Size: 0805; JLCPCB Basic Part: No; JLCPCB Part Number: C342798; Supplier 1: LCSC; Category: Capacitors - MLCC; Supplier Part Number 1: C342798; Tolerance: ±10%; Voltage Rating: 25V; Temperature Coefficient: X6S; RoHS: Yes; ComponentLink1Description: Datasheet; ComponentLink1URL: https://wmsc.lcsc.com/wmsc/upload/file/pdf/v2/lcsc/2304140030_TDK-C2012X6S1E475KT000N_C342798.pdf; ComponentLink2Description: JLCPCB Part URL; ComponentLink2URL: https://jlcpcb.com/partdetail/C342798; ComponentLink3Description: LCSC Part URL; ComponentLink3URL: https://lcsc.com/product-detail/Multilayer-Ceramic-Capacitors-MLCC---SMD-SMT_TDK-TDK-C2012X6S1E475KT000N_C342798.html
footprint CAP-0805 (0805 (2012M) Capacitor)
pins: 1, 2

## C2012X6S1H335KT000E
designator C?  Capacitance: 3.3uF  (hidden comment: *)
Capacitor, Ceramic (MLCC), 3.3uF, ±10%, 50V, X6S, ±10%, SMD 0805; Manufacturer: TDK; Manufacturer Part Number: C2012X6S1H335KT000E; Package Size: 0805; JLCPCB Basic Part: No; JLCPCB Part Number: C338093; Supplier 1: LCSC; Category: Capacitors - MLCC; Supplier Part Number 1: C338093; Tolerance: ±10%; Voltage Rating: 50V; Temperature Coefficient: X6S; RoHS: Yes; ComponentLink1Description: Datasheet; ComponentLink1URL: https://wmsc.lcsc.com/wmsc/upload/file/pdf/v2/lcsc/2304140030_TDK-C2012X6S1H335KT000E_C338093.pdf; ComponentLink2Description: JLCPCB Part URL; ComponentLink2URL: https://jlcpcb.com/partdetail/C338093; ComponentLink3Description: LCSC Part URL; ComponentLink3URL: https://lcsc.com/product-detail/Multilayer-Ceramic-Capacitors-MLCC---SMD-SMT_TDK-TDK-C2012X6S1H335KT000E_C338093.html
footprint CAP-0805 (0805 (2012M) Capacitor)
pins: 1, 2

## C2012X6S1H475KT000E
designator C?  Capacitance: 4.7uF  (hidden comment: *)
Capacitor, Ceramic (MLCC), 4.7uF, ±10%, 50V, X6S, ±10%, SMD 0805; Manufacturer: TDK; Manufacturer Part Number: C2012X6S1H475KT000E; Package Size: 0805; JLCPCB Basic Part: No; JLCPCB Part Number: C342753; Supplier 1: LCSC; Category: Capacitors - MLCC; Supplier Part Number 1: C342753; Tolerance: ±10%; Voltage Rating: 50V; Temperature Coefficient: X6S; RoHS: Yes; ComponentLink1Description: Datasheet; ComponentLink1URL: https://wmsc.lcsc.com/wmsc/upload/file/pdf/v2/lcsc/2304140030_TDK-C2012X6S1H475KT000E_C342753.pdf; ComponentLink2Description: JLCPCB Part URL; ComponentLink2URL: https://jlcpcb.com/partdetail/C342753; ComponentLink3Description: LCSC Part URL; ComponentLink3URL: https://lcsc.com/product-detail/Multilayer-Ceramic-Capacitors-MLCC---SMD-SMT_TDK-TDK-C2012X6S1H475KT000E_C342753.html
footprint CAP-0805 (0805 (2012M) Capacitor)
pins: 1, 2

## C2012X7R0J106MT0A0N
designator C?  Capacitance: 10uF  (hidden comment: *)
Capacitor, Ceramic (MLCC), 10uF, ±20%, 6.3V, X7R, ±20%, SMD 0805; Manufacturer: TDK; Manufacturer Part Number: C2012X7R0J106MT0A0N; Package Size: 0805; JLCPCB Basic Part: No; JLCPCB Part Number: C342752; Supplier 1: LCSC; Category: Capacitors - MLCC; Supplier Part Number 1: C342752; Tolerance: ±20%; Voltage Rating: 6.3V; Temperature Coefficient: X7R; RoHS: Yes; ComponentLink1Description: Datasheet; ComponentLink1URL: https://wmsc.lcsc.com/wmsc/upload/file/pdf/v2/lcsc/2304140030_TDK-C2012X7R0J106MT0A0N_C342752.pdf; ComponentLink2Description: JLCPCB Part URL; ComponentLink2URL: https://jlcpcb.com/partdetail/C342752; ComponentLink3Description: LCSC Part URL; ComponentLink3URL: https://lcsc.com/product-detail/Multilayer-Ceramic-Capacitors-MLCC---SMD-SMT_TDK-TDK-C2012X7R0J106MT0A0N_C342752.html
footprint CAP-0805 (0805 (2012M) Capacitor)
pins: 1, 2
